# Altium schematic symbol library AliPadash.SchLib: 1186 symbols (part 4 of 6)
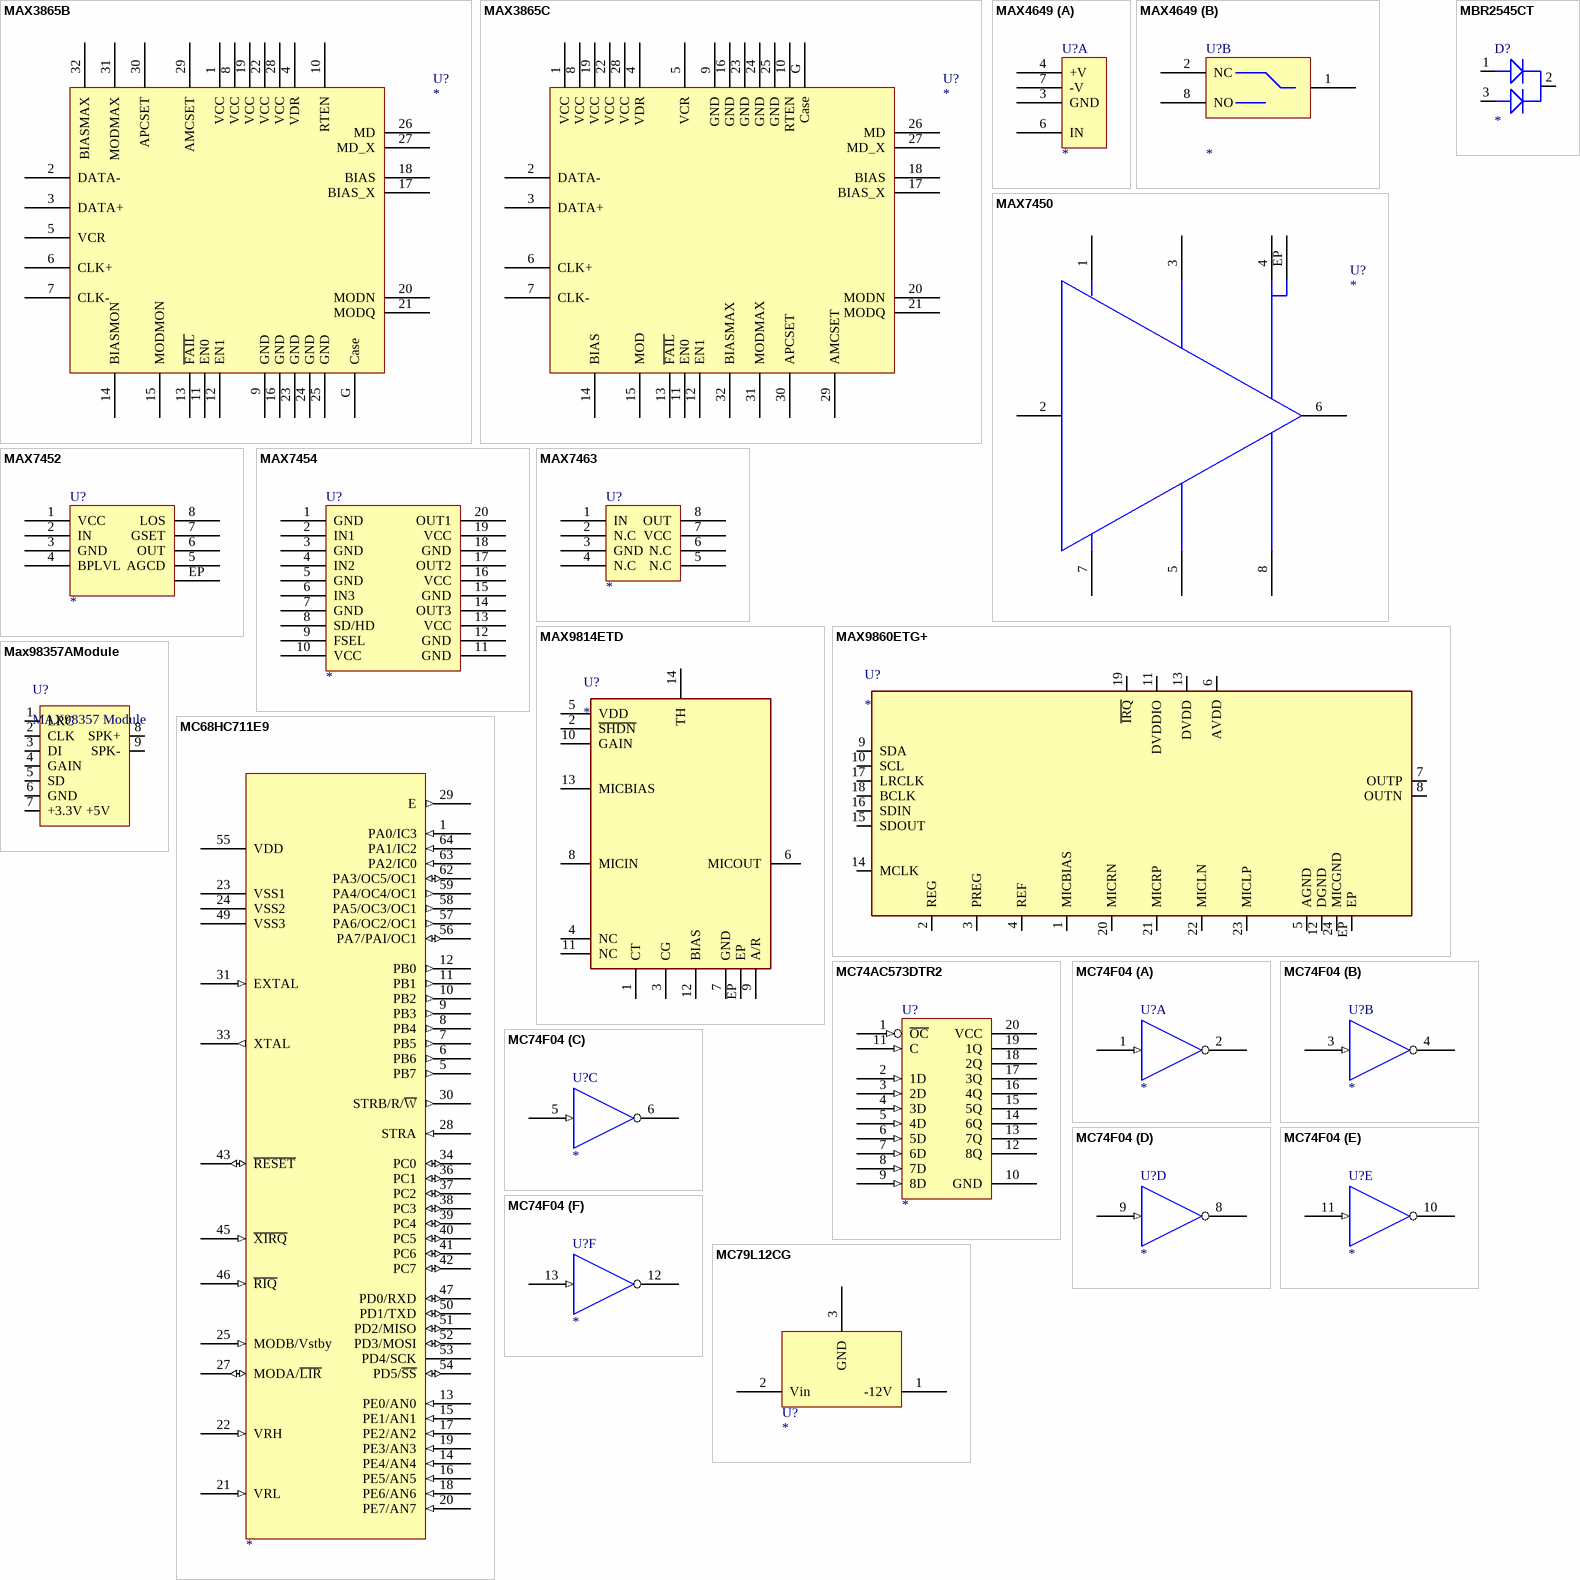
[diagram p89: symbols MAX3865B to MC79L12CG]

## MC68HC711E9
designator ?
pins: 1 PA0/IC3 (in), 5 PB7 (out), 6 PB6 (out), 7 PB5 (out), 8 PB4 (out), 9 PB3 (out), 10 PB2 (out), 11 PB1 (out), 12 PB0 (out), 13 PE0/AN0 (in), 14 PE4/AN4 (in), 15 PE1/AN1 (in), 16 PE5/AN5 (in), 17 PE2/AN2 (in), 18 PE6/AN6 (in), 19 PE3/AN3 (in), 20 PE7/AN7 (in), 21 VRL (in), 22 VRH (in), 23 VSS1 (power), 24 VSS2 (power), 25 MODB/Vstby (in), 27 MODA/~{LIR} (io), 28 STRA (in), 29 E (out), 30 STRB/R/~{W} (out), 31 EXTAL (in), 33 XTAL (out), 34 PC0 (io), 36 PC1 (io), 37 PC2 (io), 38 PC3 (io), 39 PC4 (io), 40 PC5 (io), 41 PC6 (io), 42 PC7 (io), 43 ~{RESET} (io), 45 ~{XIRQ} (in), 46 ~{RIQ} (in), 47 PD0/RXD (io), 49 VSS3 (power), 50 PD1/TXD (io), 51 PD2/MISO (io), 52 PD3/MOSI (io), 53 PD4/SCK, 54 PD5/~{SS} (io), 55 VDD (power), 56 PA7/PAI/OC1 (io), 57 PA6/OC2/OC1 (out), 58 PA5/OC3/OC1 (out), 59 PA4/OC4/OC1 (out), 62 PA3/OC5/OC1 (io), 63 PA2/IC0 (in), 64 PA1/IC2 (in)

## MC74AC573DTR2
designator U?
OCTAL D-TYPE TRANSPARENT LCH 3SO
footprint SO-20
footprint DIP-20
pins: 1 ~{OC} (in), 2 1D (in), 3 2D (in), 4 3D (in), 5 4D (in), 6 5D (in), 7 6D (in), 8 7D (in), 9 8D (in), 10 GND (power), 11 C (in), 12 8Q (hiz), 13 7Q (hiz), 14 6Q (hiz), 15 5Q (hiz), 16 4Q (hiz), 17 3Q (hiz), 18 2Q (hiz), 19 1Q (hiz), 20 VCC (power)
1 alternate drawing of the same symbol

## MC74F04
designator U?
Hex Inverters
footprint SOIC14
footprint DIP14
part A pins: 1 (in), 2, 7 GND (power) hidden to GND, 14 VCC (power) hidden to VCC
part B pins: 3 (in), 4, 7 GND (power) hidden to GND, 14 VCC (power) hidden to VCC
part C pins: 5 (in), 6, 7 GND (power) hidden to GND, 14 VCC (power) hidden to VCC
part D pins: 7 GND (power) hidden to GND, 8, 9 (in), 14 VCC (power) hidden to VCC
part E pins: 7 GND (power) hidden to GND, 10, 11 (in), 14 VCC (power) hidden to VCC
part F pins: 7 GND (power) hidden to GND, 12, 13 (in), 14 VCC (power) hidden to VCC
2 alternate drawings of the same symbol

## MC79L12CG
designator U?
footprint TO39
pins: 1 -12V, 2 Vin, 3 GND

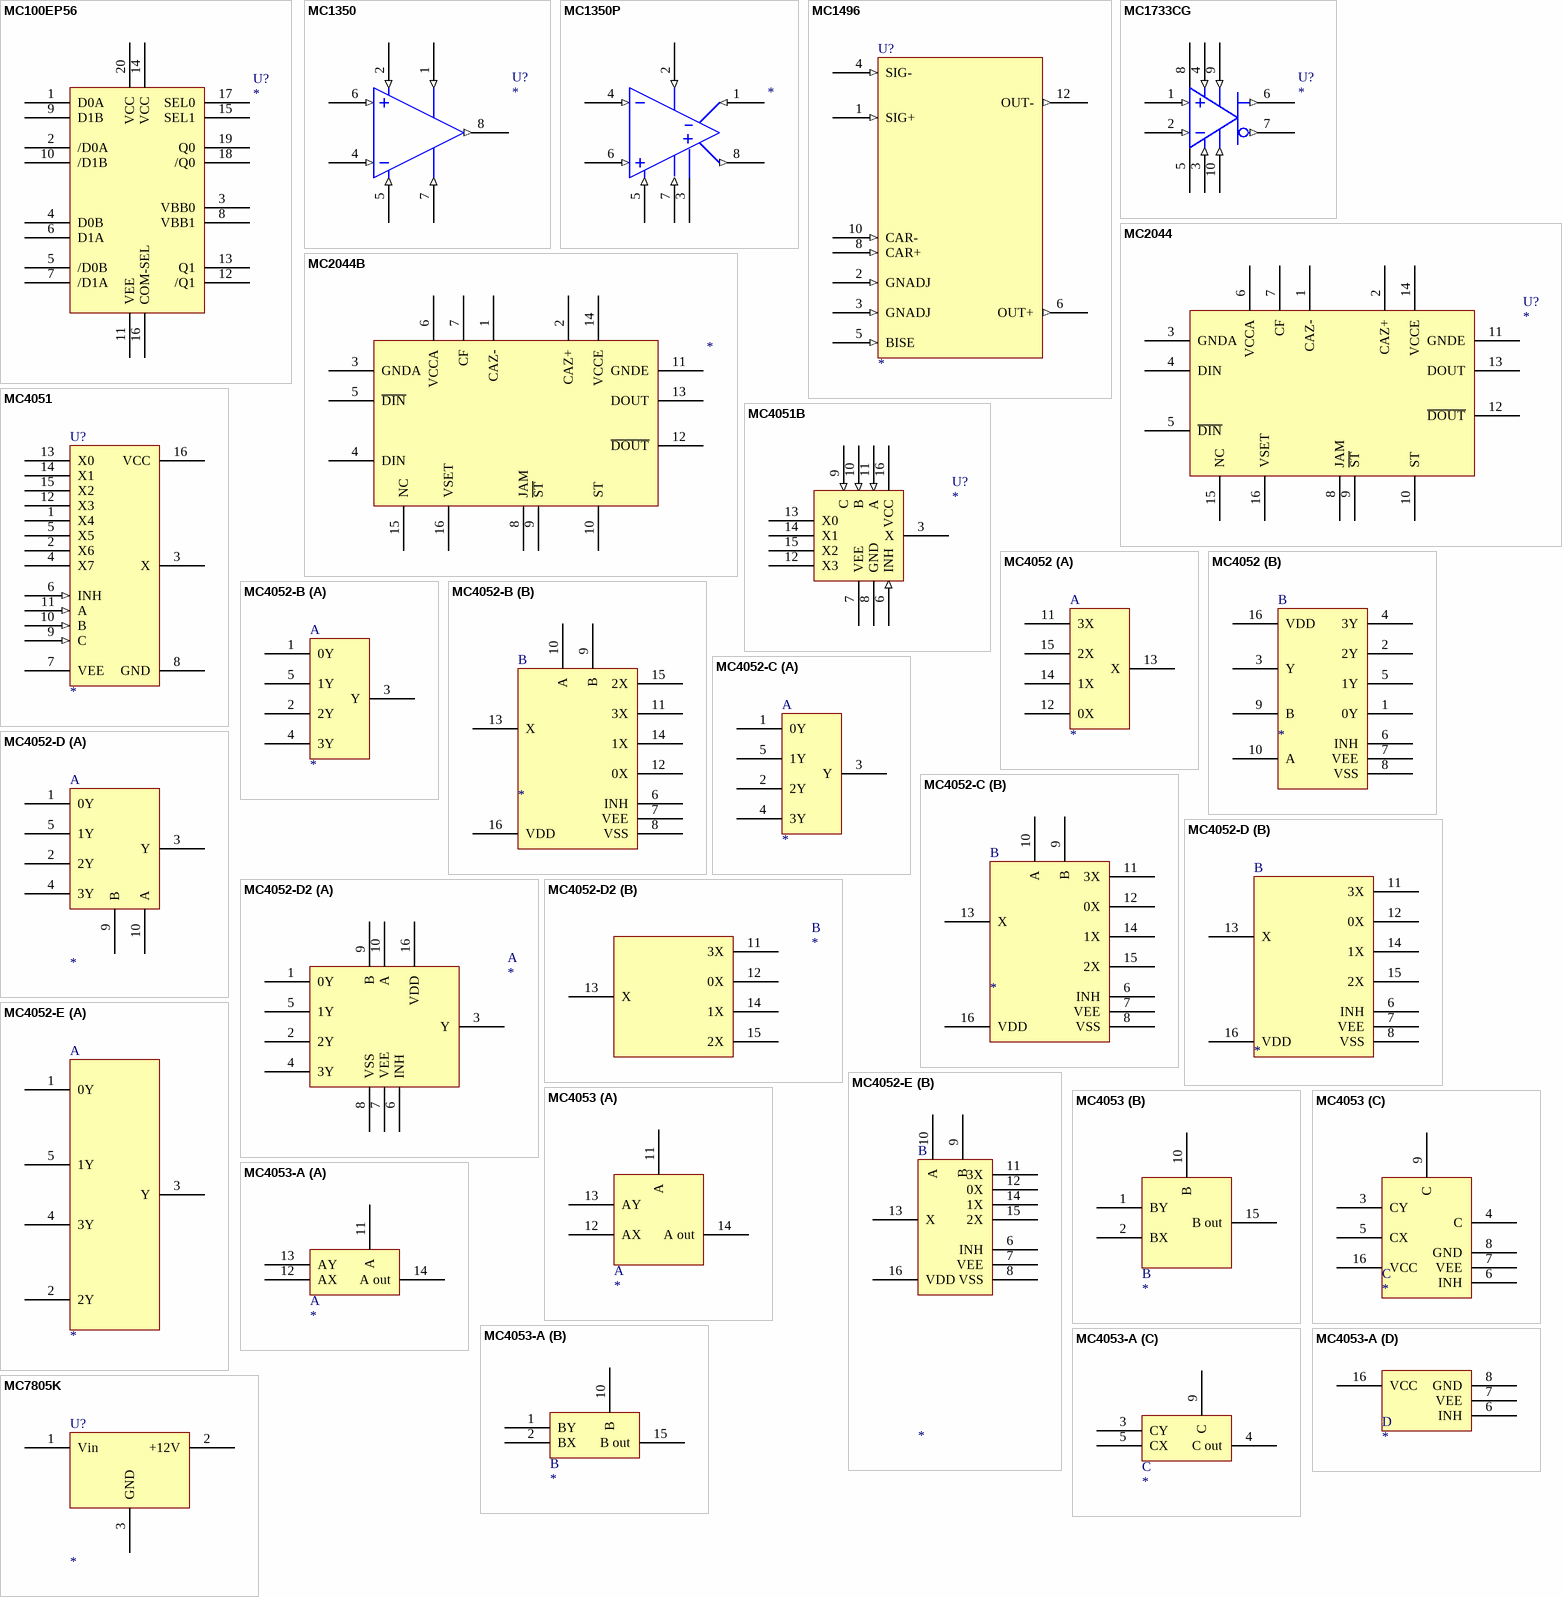
[diagram p42: symbols MC100EP56 to MC7805K]

## MC100EP56
designator U?
footprint SO-20WB
pins: 1 D0A, 2 /D0A, 3 VBB0, 4 D0B, 5 /D0B, 6 D1A, 7 /D1A, 8 VBB1, 9 D1B, 10 /D1B, 11 VEE, 12 /Q1, 13 Q1, 14 VCC, 15 SEL1, 16 COM-SEL, 17 SEL0, 18 /Q0, 19 Q0, 20 VCC

## MC1350
designator U?
pins: 1 VCC (in), 2 PLUS V (in), 4 MINUS INPUT (in), 5 MINUS V (in), 6 PLUS INPUT (in), 7 BB (in), 8 OUTPUT (out)

## MC1350P
designator ?
pins: 1 OUT- (in), 2 VCC (in), 3 GND, 4 IN- (in), 5 AGC (in), 6 IN+ (in), 7 GND (in), 8 OUT+ (out)

## MC1496
designator U?
pins: 1 SIG+ (in), 2 GNADJ (in), 3 GNADJ (in), 4 SIG- (in), 5 BISE (in), 6 OUT+ (out), 8 CAR+ (in), 10 CAR- (in), 12 OUT- (out), 14 VEE (power) hidden to VEE

## MC1733CG
designator U?
pins: 1 INPUT1 (in), 2 INPUT2 (in), 3 GAIN1B (in), 4 GAIN1A (in), 5 VEE, 6 OUT1 (out), 7 OUT2 (out), 8 VCC, 9 GAIN2A (in), 10 GAIN2B (in)

## MC2044
designator U?
footprint SO-16
pins: 1 CAZ-, 2 CAZ+, 3 GNDA, 4 DIN, 5 ~{DIN}, 6 VCCA, 7 CF, 8 JAM, 9 ~{ST}, 10 ST, 11 GNDE, 12 ~{DOUT}, 13 DOUT, 14 VCCE, 15 NC, 16 VSET

## MC2044B
designator ?
pins: 1 CAZ-, 2 CAZ+, 3 GNDA, 4 DIN, 5 ~{DIN}, 6 VCCA, 7 CF, 8 JAM, 9 ~{ST}, 10 ST, 11 GNDE, 12 ~{DOUT}, 13 DOUT, 14 VCCE, 15 NC, 16 VSET

## MC4051
designator U?
footprint DIP16
pins: 1 X4, 2 X6, 3 X, 4 X7, 5 X5, 6 INH (in), 7 VEE, 8 GND (power), 9 C (in), 10 B (in), 11 A (in), 12 X3, 13 X0, 14 X1, 15 X2, 16 VCC (power)

## MC4051B
designator U?
footprint DIP16
pins: 3 X, 6 INH (in), 7 VEE, 8 GND (power), 9 C (in), 10 B (in), 11 A (in), 12 X3, 13 X0, 14 X1, 15 X2, 16 VCC (power)

## MC4052
designator ?
part A pins: 11 3X, 12 0X, 13 X, 14 1X, 15 2X
part B pins: 1 0Y, 2 2Y, 3 Y, 4 3Y, 5 1Y, 6 INH, 7 VEE, 8 VSS, 9 B, 10 A, 16 VDD

## MC4052-B
designator ?
part A pins: 1 0Y, 2 2Y, 3 Y, 4 3Y, 5 1Y
part B pins: 6 INH, 7 VEE, 8 VSS, 9 B, 10 A, 11 3X, 12 0X, 13 X, 14 1X, 15 2X, 16 VDD

## MC4052-C
designator ?
part A pins: 1 0Y, 2 2Y, 3 Y, 4 3Y, 5 1Y
part B pins: 6 INH, 7 VEE, 8 VSS, 9 B, 10 A, 11 3X, 12 0X, 13 X, 14 1X, 15 2X, 16 VDD

## MC4052-D
designator ?
part A pins: 1 0Y, 2 2Y, 3 Y, 4 3Y, 5 1Y, 9 B, 10 A
part B pins: 6 INH, 7 VEE, 8 VSS, 11 3X, 12 0X, 13 X, 14 1X, 15 2X, 16 VDD

## MC4052-D2
designator ?
part A pins: 1 0Y, 2 2Y, 3 Y, 4 3Y, 5 1Y, 6 INH, 7 VEE, 8 VSS, 9 B, 10 A, 16 VDD
part B pins: 11 3X, 12 0X, 13 X, 14 1X, 15 2X

## MC4052-E
designator ?
part A pins: 1 0Y, 2 2Y, 3 Y, 4 3Y, 5 1Y
part B pins: 6 INH, 7 VEE, 8 VSS, 9 B, 10 A, 11 3X, 12 0X, 13 X, 14 1X, 15 2X, 16 VDD

## MC4053
designator ?
part A pins: 11 A, 12 AX, 13 AY, 14 A out
part B pins: 1 BY, 2 BX, 10 B, 15 B out
part C pins: 3 CY, 4 C, 5 CX, 6 INH, 7 VEE, 8 GND, 9 C, 16 VCC

## MC4053-A
designator ?
part A pins: 11 A, 12 AX, 13 AY, 14 A out
part B pins: 1 BY, 2 BX, 10 B, 15 B out
part C pins: 3 CY, 4 C out, 5 CX, 9 C
part D pins: 6 INH, 7 VEE, 8 GND, 16 VCC

## MC7805K
designator U?
footprint TO3
pins: 1 Vin, 2 +12V, 3 GND

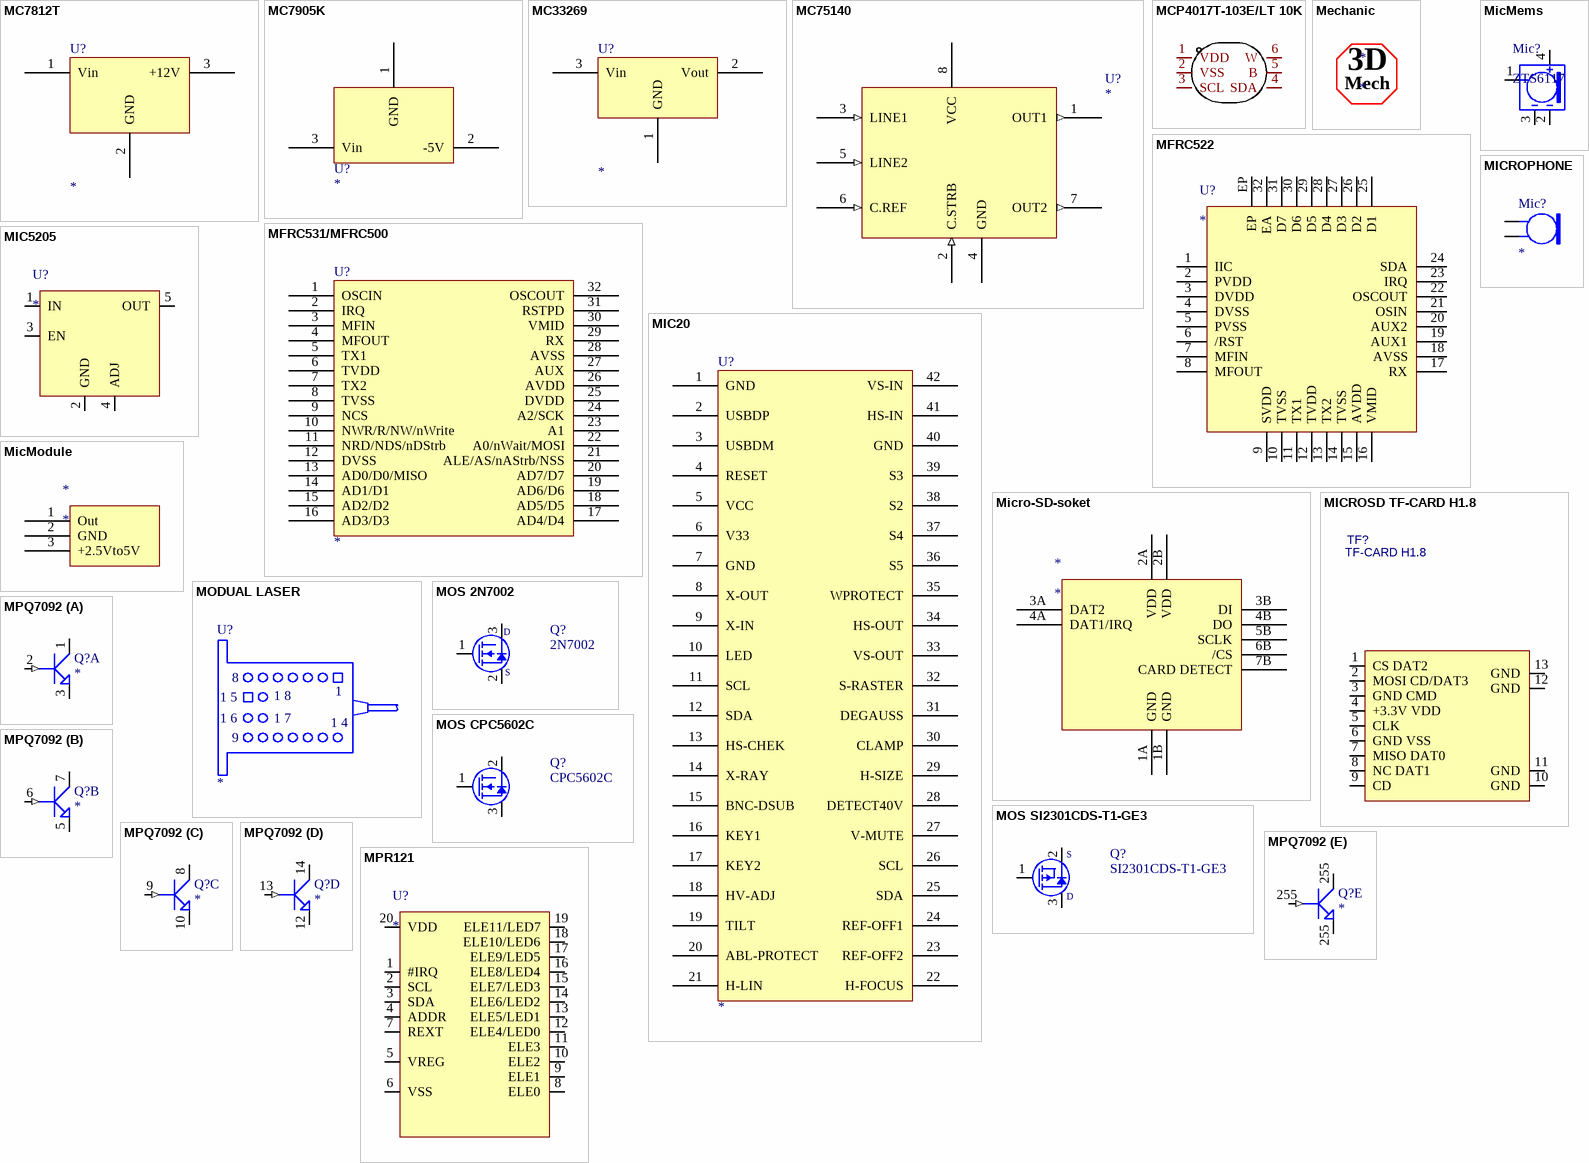
[diagram p43: symbols MC7812T to MPR121]

## MC7812T
designator U?
footprint TO220
pins: 1 Vin, 2 GND, 3 +12V

## MC7905K
designator U?
footprint TO3
pins: 1 GND, 2 -5V, 3 Vin

## MC33269
designator U?
footprint TO-255AA
pins: 1 GND, 2 Vout, 3 Vin

## MC75140
designator U?
pins: 1 OUT1 (out), 2 C.STRB (in), 3 LINE1 (in), 4 GND, 5 LINE2 (in), 6 C.REF (in), 7 OUT2 (out), 8 VCC

## MCP4017T-103E/LT 10K
designator U?, comment R10K MCP4017T-103E/LT  (value not drawn)
Manufacturer: MICROCHIP(美国微芯); Add into BOM: yes; Resistance Value (Ohms): 10kΩ; Number of Taps: 128; Interface Type: I2C; Number of Channels: 1; Supply Voltage: 1.8V~5.5V; Precision: ±20%; Temperature Coefficient (Typ): 150ppm/℃; Symbol: MCP4017T-103E/LT; Device: MCP4017T-103E/LT; LCSC Part Name: MCP4017T-103E/LT; Supplier Part: C623396; Manufacturer Part: MCP4017T-103E/LT; Supplier Footprint: SC-70-6; JLC: C623396; Datasheet: https://atta.szlcsc.com/upload/public/pdf/source/20171212/C145561_15130636359521177681.pdf; Supplier: LCSC; Convert to PCB: yes; Operating Temperature: -40℃~+125℃; MFAC: MCP4017T-103E/LT
footprint SC-70-6 (Footprint not found)
pins: 1 VDD, 2 VSS, 3 SCL, 4 SDA, 5 B, 6 W

## Mechanic
designator *
text: 3D; Mech

## MFRC522
designator U?
footprint QFN32
pins: 1 IIC, 2 PVDD, 3 DVDD, 4 DVSS, 5 PVSS, 6 /RST, 7 MFIN, 8 MFOUT, 9 SVDD, 10 TVSS, 11 TX1, 12 TVDD, 13 TX2, 14 TVSS, 15 AVDD, 16 VMID, 17 RX, 18 AVSS, 19 AUX1, 20 AUX2, 21 OSIN, 22 OSCOUT, 23 IRQ, 24 SDA, 25 D1, 26 D2, 27 D3, 28 D4, 29 D5, 30 D6, 31 D7, 32 EA, EP

## MFRC531/MFRC500
designator U?
footprint SO-32
pins: 1 OSCIN, 2 IRQ, 3 MFIN, 4 MFOUT, 5 TX1, 6 TVDD, 7 TX2, 8 TVSS, 9 NCS, 10 NWR/R/NW/nWrite, 11 NRD/NDS/nDStrb, 12 DVSS, 13 AD0/D0/MISO, 14 AD1/D1, 15 AD2/D2, 16 AD3/D3, 17 AD4/D4, 18 AD5/D5, 19 AD6/D6, 20 AD7/D7, 21 ALE/AS/nAStrb/NSS, 22 A0/nWait/MOSI, 23 A1, 24 A2/SCK, 25 DVDD, 26 AVDD, 27 AUX, 28 AVSS, 29 RX, 30 VMID, 31 RSTPD, 32 OSCOUT

## MIC20
designator U?
footprint DIL42A
pins: 1 GND, 2 USBDP, 3 USBDM, 4 RESET, 5 VCC, 6 V33, 7 GND, 8 X-OUT, 9 X-IN, 10 LED, 11 SCL, 12 SDA, 13 HS-CHEK, 14 X-RAY, 15 BNC-DSUB, 16 KEY1, 17 KEY2, 18 HV-ADJ, 19 TILT, 20 ABL-PROTECT, 21 H-LIN, 22 H-FOCUS, 23 REF-OFF2, 24 REF-OFF1, 25 SDA, 26 SCL, 27 V-MUTE, 28 DETECT40V, 29 H-SIZE, 30 CLAMP, 31 DEGAUSS, 32 S-RASTER, 33 VS-OUT, 34 HS-OUT, 35 WPROTECT, 36 S5, 37 S4, 38 S2, 39 S3, 40 GND, 41 HS-IN, 42 VS-IN

## MIC5205
designator U?
footprint SOT-25
pins: 1 IN, 2 GND, 3 EN, 4 ADJ, 5 OUT

## MicMems
designator Mic?, comment ZTS6117
JLC: C481300; MFAC: ZTS6117
footprint MicMems
pins: 1, 2, 3, 4

## MicModule
designator *
pins: 1 Out, 2 GND, 3 +2.5Vto5V

## Micro-SD-soket
designator *
pins: 1A GND, 1B GND, 2A VDD, 2B VDD, 3A DAT2, 3B DI, 4A DAT1/IRQ, 4B DO, 5B SCLK, 6B /CS, 7B CARD DETECT

## MICROPHONE
designator Mic?
footprint Model Name (Footprint not found)
pins: 1, 2

## MICROSD TF-CARD H1.8
designator TF?, comment TF-CARD H1.8
JLC: C7529389; MAFC: TF-CARD H1.8
footprint TF-SMD_TF-CARD-H1.8
pins: 1 CS DAT2, 2 MOSI CD/DAT3, 3 GND CMD, 4 +3.3V VDD, 5 CLK, 6 GND VSS, 7 MISO DAT0, 8 NC DAT1, 9 CD, 10 GND, 11 GND, 12 GND, 13 GND

## MODUAL LASER
designator U?
text: 8; 1; 1 5; 1 8; 1 6; 1 7; 1 4; 9

## MOS 2N7002
designator Q?, comment 2N7002
JLC: C8545; MFAC: 2N7002
footprint SOT-23
pins: 1, 2, 3
text: D; S

## MOS CPC5602C
designator Q?, comment CPC5602C
MFAC: CPC5602CTR; JLC: C461289
footprint CPC5602C
pins: 1, 2, 3

## MOS SI2301CDS-T1-GE3
designator Q?, comment SI2301CDS-T1-GE3
JLC: C10487; MFAC: SI2301CDS-T1-GE3
footprint SOT-23
pins: 1, 2, 3
text: S; D

## MPQ7092
designator Q?
part A pins: 1 C, 2 B (in), 3 E
part B pins: 5 E, 6 B (in), 7 C
part C pins: 8 C, 9 B (in), 10 E
part D pins: 12 E, 13 B (in), 14 C
part E pins: 255 C, 255 B (in), 255 E

## MPR121
designator U?
pins: 1 #IRQ (io), 2 SCL (io), 3 SDA (io), 4 ADDR (io), 5 VREG (io), 6 VSS (power), 7 REXT (io), 8 ELE0 (io), 9 ELE1 (io), 10 ELE2 (io), 11 ELE3 (io), 12 ELE4/LED0 (io), 13 ELE5/LED1 (io), 14 ELE6/LED2 (io), 15 ELE7/LED3 (io), 16 ELE8/LED4 (io), 17 ELE9/LED5 (io), 18 ELE10/LED6 (io), 19 ELE11/LED7 (io), 20 VDD (power)

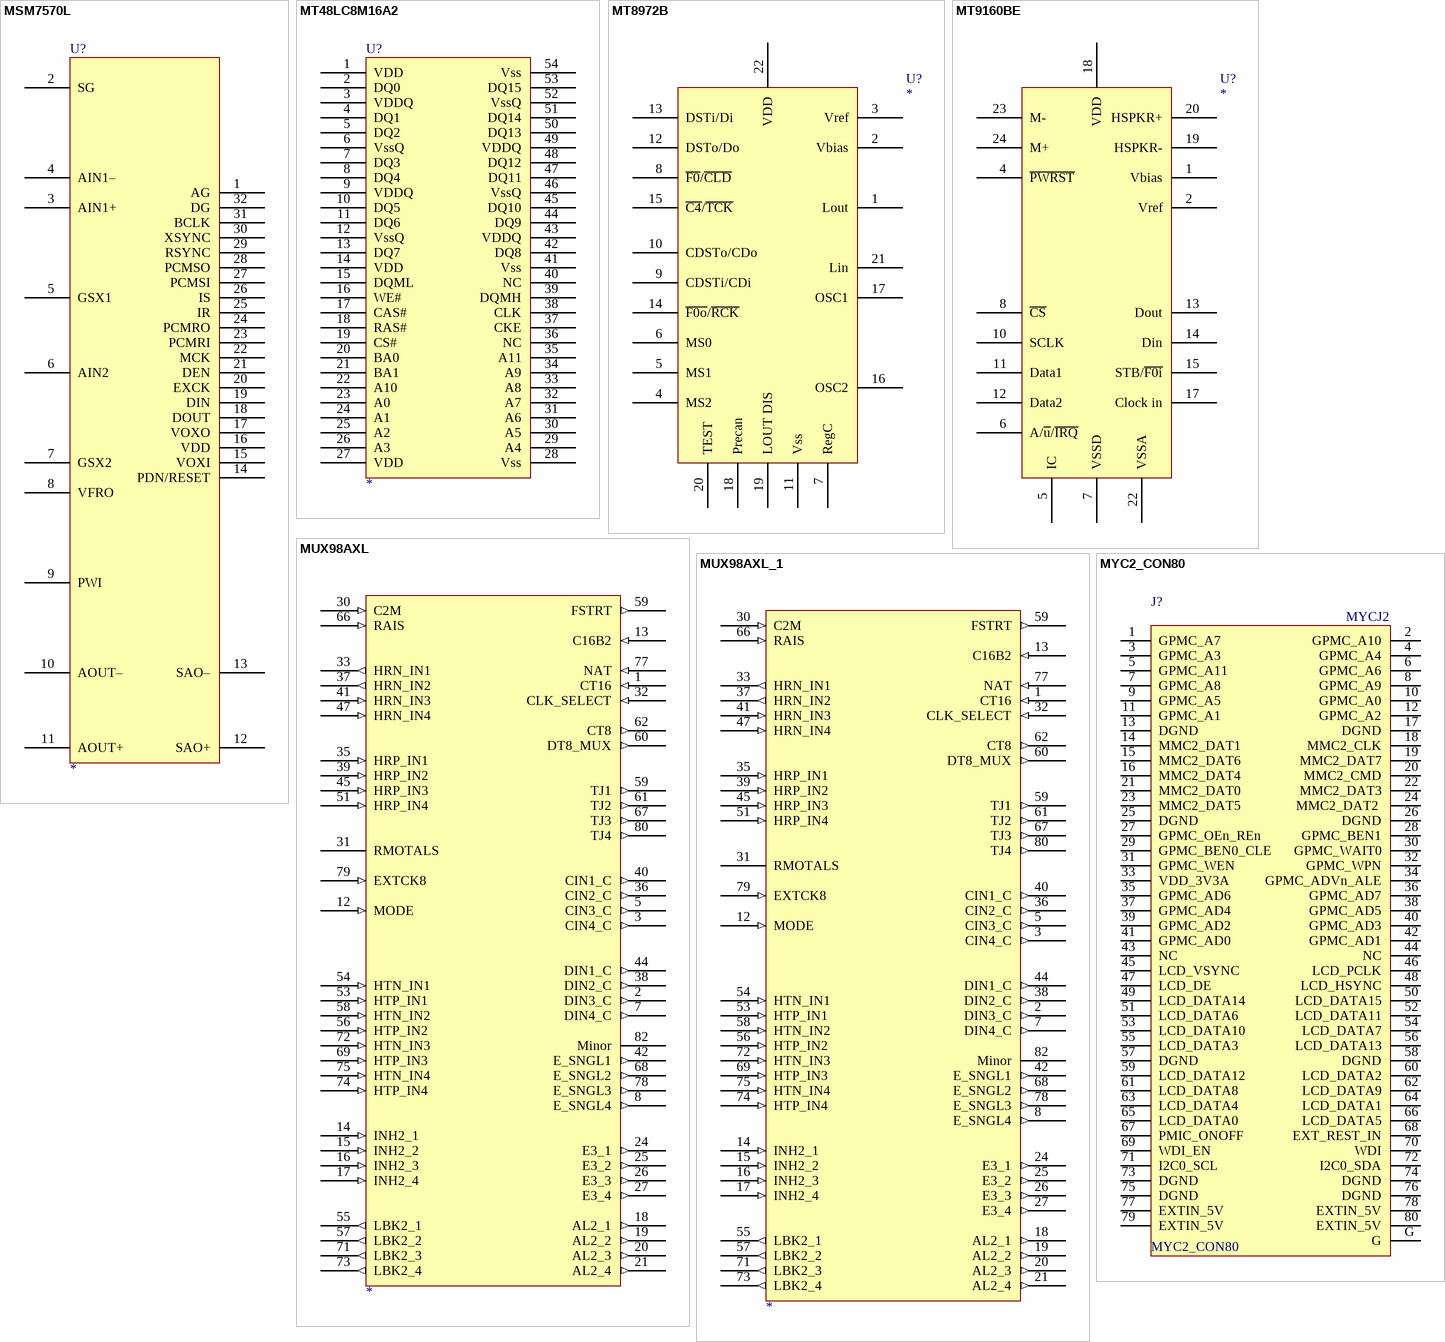
[diagram p44: symbols MSM7570L to MYC2_CON80]

## MSM7570L
designator U?
footprint TSOP32B
pins: 1 AG, 2 SG, 3 AIN1+, 4 AIN1–, 5 GSX1, 6 AIN2, 7 GSX2, 8 VFRO, 9 PWI, 10 AOUT–, 11 AOUT+, 12 SAO+, 13 SAO–, 14 PDN/RESET, 15 VOXI, 16 VDD, 17 VOXO, 18 DOUT, 19 DIN, 20 EXCK, 21 DEN, 22 MCK, 23 PCMRI, 24 PCMRO, 25 IR, 26 IS, 27 PCMSI, 28 PCMSO, 29 RSYNC, 30 XSYNC, 31 BCLK, 32 DG

## MT48LC8M16A2
designator U?
footprint TSOP54
pins: 1 VDD, 2 DQ0, 3 VDDQ, 4 DQ1, 5 DQ2, 6 VssQ, 7 DQ3, 8 DQ4, 9 VDDQ, 10 DQ5, 11 DQ6, 12 VssQ, 13 DQ7, 14 VDD, 15 DQML, 16 WE#, 17 CAS#, 18 RAS#, 19 CS#, 20 BA0, 21 BA1, 22 A10, 23 A0, 24 A1, 25 A2, 26 A3, 27 VDD, 28 Vss, 29 A4, 30 A5, 31 A6, 32 A7, 33 A8, 34 A9, 35 A11, 36 NC, 37 CKE, 38 CLK, 39 DQMH, 40 NC, 41 Vss, 42 DQ8, 43 VDDQ, 44 DQ9, 45 DQ10, 46 VssQ, 47 DQ11, 48 DQ12, 49 VDDQ, 50 DQ13, 51 DQ14, 52 VssQ, 53 DQ15, 54 Vss

## MT8972B
designator U?
footprint DIP22
pins: 1 Lout, 2 Vbias, 3 Vref, 4 MS2, 5 MS1, 6 MS0, 7 RegC, 8 ~{F0}/~{CLD}, 9 CDSTi/CDi, 10 CDSTo/CDo, 11 Vss (power), 12 DSTo/Do, 13 DSTi/Di, 14 ~{F0o}/~{RCK}, 15 ~{C4}/~{TCK}, 16 OSC2, 17 OSC1, 18 Precan, 19 LOUT DIS, 20 TEST, 21 Lin, 22 VDD (power)

## MT9160BE
designator U?
footprint DIP24
pins: 1 Vbias, 2 Vref, 4 ~{PWRST}, 5 IC (power), 6 A/~{u}/~{IRQ}, 7 VSSD (power), 8 ~{CS}, 10 SCLK, 11 Data1, 12 Data2, 13 Dout, 14 Din, 15 STB/~{F0i}, 17 Clock in, 18 VDD (power), 19 HSPKR-, 20 HSPKR+, 22 VSSA (power), 23 M-, 24 M+

## MUX98AXL
designator ?
pins: 1 CT16 (in), 2 DIN3_C (out), 3 CIN4_C (out), 5 CIN3_C (out), 6 GND (power) hidden to GND, 7 DIN4_C (out), 8 E_SNGL4 (out), 12 MODE (in), 13 C16B2 (in), 14 INH2_1 (in), 15 INH2_2 (in), 16 INH2_3 (in), 17 INH2_4 (in), 18 AL2_1 (out), 19 AL2_2 (out), 20 AL2_3 (out), 21 AL2_4 (out), 24 E3_1 (out), 25 E3_2 (out), 26 E3_3 (out), 27 E3_4 (out), 28 GND (power) hidden to GND, 30 C2M (in), 31 RMOTALS, 32 CLK_SELECT (in), 33 HRN_IN1 (out), 35 HRP_IN1 (in), 36 CIN2_C (out), 37 HRN_IN2 (out), 38 DIN2_C (out), 39 HRP_IN2 (in), 40 CIN1_C (out), 41 HRN_IN3 (in), 42 E_SNGL1 (out), 44 DIN1_C (out), 45 HRP_IN3 (in), 47 HRN_IN4 (in), 49 GND (power) hidden to GND, 51 HRP_IN4 (in), 53 HTP_IN1 (in), 54 HTN_IN1 (in), 55 LBK2_1 (out), 56 HTP_IN2 (in), 57 LBK2_2 (out), 58 HTN_IN2 (in), 59 TJ1 (out), 59 FSTRT (out), 60 DT8_MUX (out), 61 TJ2 (out), 62 CT8 (out), 66 RAIS (in), 67 TJ3 (out), 68 E_SNGL2 (out), 69 HTP_IN3 (in), 70 GND (power) hidden to GND, 71 LBK2_3 (out), 72 HTN_IN3 (in), 73 LBK2_4 (out), 74 HTP_IN4 (in), 75 HTN_IN4 (in), 77 NAT (in), 78 E_SNGL3 (out), 79 EXTCK8 (in), 80 TJ4 (out), 82 Minor

## MUX98AXL_1
designator ?
pins: 1 CT16 (in), 2 DIN3_C (out), 3 CIN4_C (out), 5 CIN3_C (out), 6 GND (power) hidden to GND, 7 DIN4_C (out), 8 E_SNGL4 (out), 12 MODE (in), 13 C16B2 (in), 14 INH2_1 (in), 15 INH2_2 (in), 16 INH2_3 (in), 17 INH2_4 (in), 18 AL2_1 (out), 19 AL2_2 (out), 20 AL2_3 (out), 21 AL2_4 (out), 24 E3_1 (out), 25 E3_2 (out), 26 E3_3 (out), 27 E3_4 (out), 28 GND (power) hidden to GND, 30 C2M (in), 31 RMOTALS, 32 CLK_SELECT (in), 33 HRN_IN1 (out), 35 HRP_IN1 (in), 36 CIN2_C (out), 37 HRN_IN2 (out), 38 DIN2_C (out), 39 HRP_IN2 (in), 40 CIN1_C (out), 41 HRN_IN3 (in), 42 E_SNGL1 (out), 44 DIN1_C (out), 45 HRP_IN3 (in), 47 HRN_IN4 (in), 49 GND (power) hidden to GND, 51 HRP_IN4 (in), 53 HTP_IN1 (in), 54 HTN_IN1 (in), 55 LBK2_1 (out), 56 HTP_IN2 (in), 57 LBK2_2 (out), 58 HTN_IN2 (in), 59 TJ1 (out), 59 FSTRT (out), 60 DT8_MUX (out), 61 TJ2 (out), 62 CT8 (out), 66 RAIS (in), 67 TJ3 (out), 68 E_SNGL2 (out), 69 HTP_IN3 (in), 70 GND (power) hidden to GND, 71 LBK2_3 (out), 72 HTN_IN3 (in), 73 LBK2_4 (out), 74 HTP_IN4 (in), 75 HTN_IN4 (in), 77 NAT (in), 78 E_SNGL3 (out), 79 EXTCK8 (in), 80 TJ4 (out), 82 Minor

## MYC2_CON80
designator J?
footprint BTB2X40F (SON, 80-Leads, Body 36/20x6/00mm, Pitch 0/80mm, IPC Medium Density)
pins: 1 GPMC_A7, 2 GPMC_A10, 3 GPMC_A3, 4 GPMC_A4, 5 GPMC_A11, 6 GPMC_A6, 7 GPMC_A8, 8 GPMC_A9, 9 GPMC_A5, 10 GPMC_A0, 11 GPMC_A1, 12 GPMC_A2, 13 DGND, 14 MMC2_DAT1, 15 MMC2_DAT6, 16 MMC2_DAT4, 17 DGND, 18 MMC2_CLK, 19 MMC2_DAT7, 20 MMC2_CMD, 21 MMC2_DAT0, 22 MMC2_DAT3, 23 MMC2_DAT5 , 24 MMC2_DAT2 , 25 DGND, 26 DGND, 27 GPMC_OEn_REn, 28 GPMC_BEN1, 29 GPMC_BEN0_CLE, 30 GPMC_WAIT0, 31 GPMC_WEN, 32 GPMC_WPN, 33 VDD_3V3A, 34 GPMC_ADVn_ALE, 35 GPMC_AD6, 36 GPMC_AD7, 37 GPMC_AD4, 38 GPMC_AD5, 39 GPMC_AD2, 40 GPMC_AD3, 41 GPMC_AD0, 42 GPMC_AD1, 43 NC, 44 NC, 45 LCD_VSYNC, 46 LCD_PCLK, 47 LCD_DE, 48 LCD_HSYNC, 49 LCD_DATA14, 50 LCD_DATA15, 51 LCD_DATA6, 52 LCD_DATA11, 53 LCD_DATA10, 54 LCD_DATA7, 55 LCD_DATA3, 56 LCD_DATA13, 57 DGND, 58 DGND, 59 LCD_DATA12, 60 LCD_DATA2, 61 LCD_DATA8, 62 LCD_DATA9, 63 LCD_DATA4, 64 LCD_DATA1, 65 LCD_DATA0, 66 LCD_DATA5, 67 PMIC_ONOFF, 68 EXT_REST_IN, 69 WDI_EN, 70 WDI, 71 I2C0_SCL, 72 I2C0_SDA, 73 DGND, 74 DGND, 75 DGND, 76  DGND, 77 EXTIN_5V, 78 EXTIN_5V, 79 EXTIN_5V, 80 EXTIN_5V, G
